# Altium footprint library smd-ipc.PCBLIB: 363 footprints (part 15 of 27)
Each footprint in its own frame and in the unit in brackets; x right, y up, seen from the top. Pads: shape width x height; smd on the part's side, far side on the other; paste and mask are expansions set on the pad; w line width, h text height; cw(c..) or ccw(c..) is an arc to the next point about the centre after c.
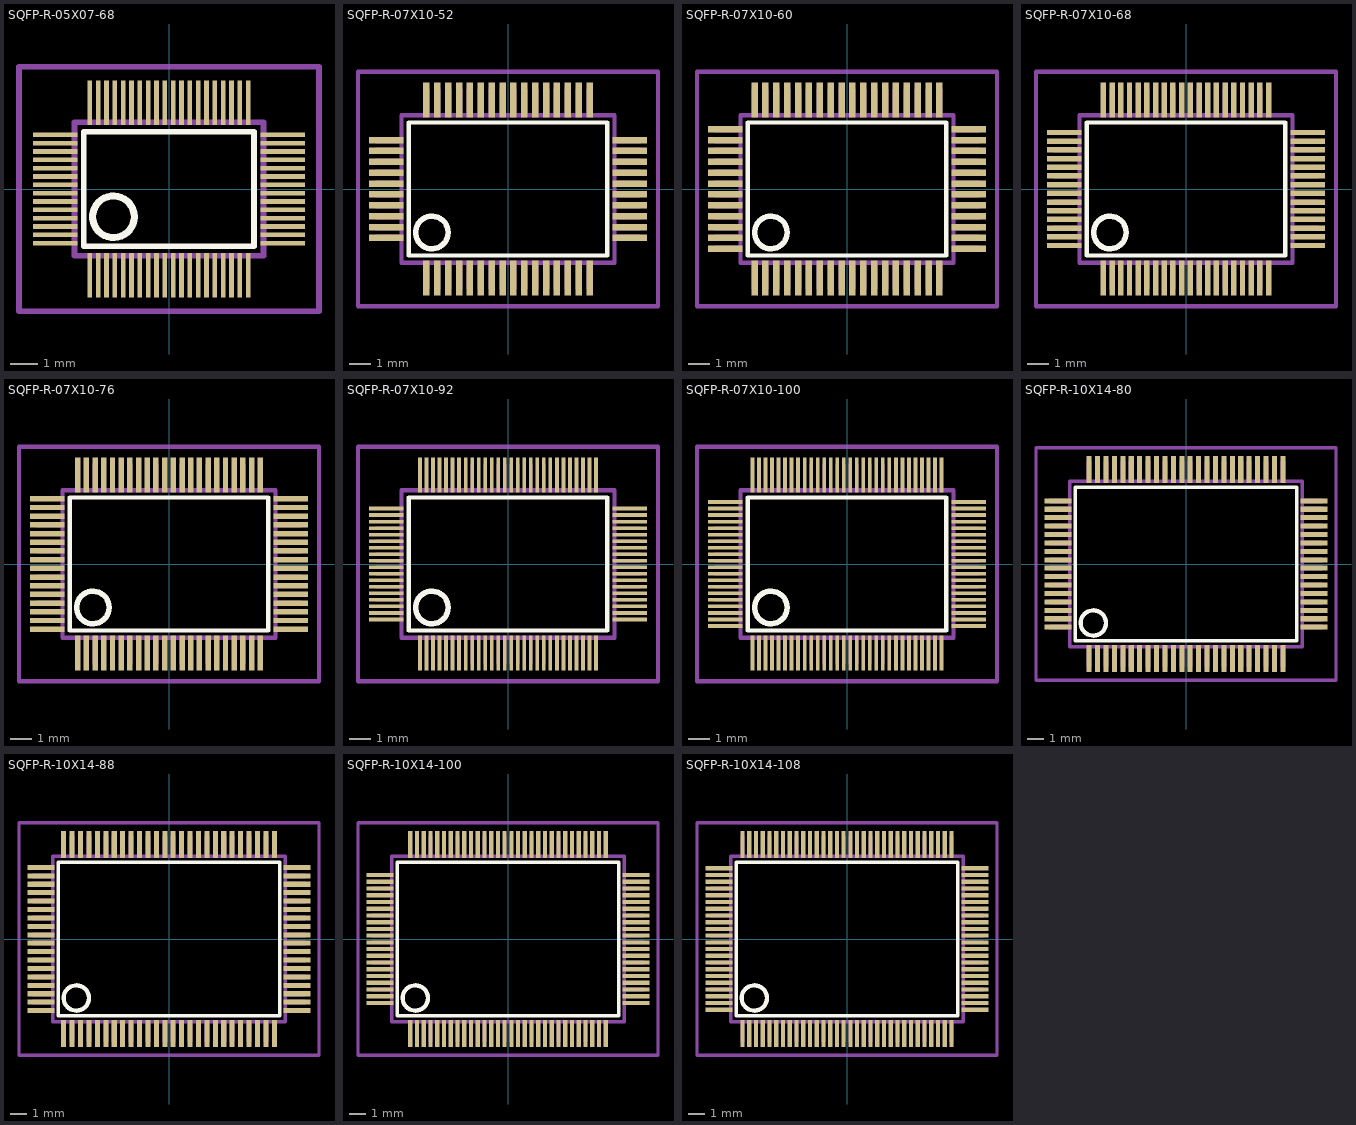
[diagram p14: the footprints below, top view; thin cyan lines are the x and y axes]

## SQFP-R-05X07-68 [mm]
pads (68):
  rect 0.17x1.6 smd: 1(-2.85,-3.1) 2(-2.55,-3.1) 3(-2.25,-3.1) 4(-1.95,-3.1) 5(-1.65,-3.1) 6(-1.35,-3.1) 7(-1.05,-3.1) 8(-0.75,-3.1) 9(-0.45,-3.1) 10(-0.15,-3.1) 11(0.15,-3.1) 12(0.45,-3.1) 13(0.75,-3.1) 14(1.05,-3.1) 15(1.35,-3.1) 16(1.65,-3.1) 17(1.95,-3.1) 18(2.25,-3.1) 19(2.55,-3.1) 20(2.85,-3.1) 35(2.85,3.1) 36(2.55,3.1) 37(2.25,3.1) 38(1.95,3.1) 39(1.65,3.1) 40(1.35,3.1) 41(1.05,3.1) 42(0.75,3.1) 43(0.45,3.1) 44(0.15,3.1) 45(-0.15,3.1) 46(-0.45,3.1) 47(-0.75,3.1) 48(-1.05,3.1) 49(-1.35,3.1) 50(-1.65,3.1) 51(-1.95,3.1) 52(-2.25,3.1) 53(-2.55,3.1) 54(-2.85,3.1)
  rect 1.6x0.17 smd: 21(4.1,-1.95) 22(4.1,-1.65) 23(4.1,-1.35) 24(4.1,-1.05) 25(4.1,-0.75) 26(4.1,-0.45) 27(4.1,-0.15) 28(4.1,0.15) 29(4.1,0.45) 30(4.1,0.75) 31(4.1,1.05) 32(4.1,1.35) 33(4.1,1.65) 34(4.1,1.95) 55(-4.1,1.95) 56(-4.1,1.65) 57(-4.1,1.35) 58(-4.1,1.05) 59(-4.1,0.75) 60(-4.1,0.45) 61(-4.1,0.15) 62(-4.1,-0.15) 63(-4.1,-0.45) 64(-4.1,-0.75) 65(-4.1,-1.05) 66(-4.1,-1.35) 67(-4.1,-1.65) 68(-4.1,-1.95)
Top Overlay:
  circle w0.254: c-2,-1 r0.75
  lines w0.203: -3.07,-2.06 3.06,-2.06 3.06,2.06 -3.07,2.06 -3.07,-2.06
Mechanical 16:
  rectangle: -2.92,-3.6 -2.78,-2.45
  rectangle: 3.45,-2.02 4.6,-1.88
  rectangle: -2.62,-3.6 -2.48,-2.45
  rectangle: -2.32,-3.6 -2.18,-2.45
  rectangle: -2.02,-3.6 -1.88,-2.45
  rectangle: -1.72,-3.6 -1.58,-2.45
  rectangle: -1.42,-3.6 -1.28,-2.45
  rectangle: -1.12,-3.6 -0.98,-2.45
  rectangle: -0.82,-3.6 -0.68,-2.45
  rectangle: -0.52,-3.6 -0.38,-2.45
  rectangle: -0.22,-3.6 -0.08,-2.45
  rectangle: 0.08,-3.6 0.22,-2.45
  rectangle: 0.38,-3.6 0.52,-2.45
  rectangle: 0.68,-3.6 0.82,-2.45
  rectangle: 0.98,-3.6 1.12,-2.45
  rectangle: 1.28,-3.6 1.42,-2.45
  rectangle: 1.58,-3.6 1.72,-2.45
  rectangle: 1.88,-3.6 2.02,-2.45
  rectangle: 2.18,-3.6 2.32,-2.45
  rectangle: 2.48,-3.6 2.62,-2.45
  rectangle: 2.78,-3.6 2.92,-2.45
  rectangle: 3.45,-1.72 4.6,-1.58
  rectangle: 3.45,-1.42 4.6,-1.28
  rectangle: 3.45,-1.12 4.6,-0.98
  rectangle: 3.45,-0.82 4.6,-0.68
  rectangle: 3.45,-0.52 4.6,-0.38
  rectangle: 3.45,-0.22 4.6,-0.08
  rectangle: 3.45,0.08 4.6,0.22
  rectangle: 3.45,0.38 4.6,0.52
  rectangle: 3.45,0.68 4.6,0.82
  rectangle: 3.45,0.98 4.6,1.12
  rectangle: 3.45,1.28 4.6,1.42
  rectangle: 3.45,1.58 4.6,1.72
  rectangle: 3.45,1.88 4.6,2.02
  rectangle: 2.78,2.45 2.92,3.6
  rectangle: 2.48,2.45 2.62,3.6
  rectangle: 2.18,2.45 2.32,3.6
  rectangle: 1.88,2.45 2.02,3.6
  rectangle: 1.58,2.45 1.72,3.6
  rectangle: 1.28,2.45 1.42,3.6
  rectangle: 0.98,2.45 1.12,3.6
  rectangle: 0.68,2.45 0.82,3.6
  rectangle: 0.38,2.45 0.52,3.6
  rectangle: 0.08,2.45 0.22,3.6
  rectangle: -0.22,2.45 -0.08,3.6
  rectangle: -0.52,2.45 -0.38,3.6
  rectangle: -0.82,2.45 -0.68,3.6
  rectangle: -1.12,2.45 -0.98,3.6
  rectangle: -1.42,2.45 -1.28,3.6
  rectangle: -1.72,2.45 -1.58,3.6
  rectangle: -2.02,2.45 -1.88,3.6
  rectangle: -2.32,2.45 -2.18,3.6
  rectangle: -2.62,2.45 -2.48,3.6
  rectangle: -2.92,2.45 -2.78,3.6
  rectangle: -4.6,1.88 -3.45,2.02
  rectangle: -4.6,1.58 -3.45,1.72
  rectangle: -4.6,1.28 -3.45,1.42
  rectangle: -4.6,0.98 -3.45,1.12
  rectangle: -4.6,0.68 -3.45,0.82
  rectangle: -4.6,0.38 -3.45,0.52
  rectangle: -4.6,0.08 -3.45,0.22
  rectangle: -4.6,-0.22 -3.45,-0.08
  rectangle: -4.6,-0.52 -3.45,-0.38
  rectangle: -4.6,-0.82 -3.45,-0.68
  rectangle: -4.6,-1.12 -3.45,-0.98
  rectangle: -4.6,-1.42 -3.45,-1.28
  rectangle: -4.6,-1.72 -3.45,-1.58
  rectangle: -4.6,-2.02 -3.45,-1.88
  lines w0.203: -3.4,-2.4 3.4,-2.4 3.4,2.4 -3.4,2.4 -3.4,-2.4
Mechanical 27:
  lines w0.2: -5.4,-4.4 -5.4,4.4 5.4,4.4 5.4,-4.4 -5.4,-4.4

## SQFP-R-07X10-52 [mm]
pads (52):
  rect 0.3x1.6 smd: 1(-3.75,-4.1) 2(-3.25,-4.1) 3(-2.75,-4.1) 4(-2.25,-4.1) 5(-1.75,-4.1) 6(-1.25,-4.1) 7(-0.75,-4.1) 8(-0.25,-4.1) 9(0.25,-4.1) 10(0.75,-4.1) 11(1.25,-4.1) 12(1.75,-4.1) 13(2.25,-4.1) 14(2.75,-4.1) 15(3.25,-4.1) 16(3.75,-4.1) 27(3.75,4.1) 28(3.25,4.1) 29(2.75,4.1) 30(2.25,4.1) 31(1.75,4.1) 32(1.25,4.1) 33(0.75,4.1) 34(0.25,4.1) 35(-0.25,4.1) 36(-0.75,4.1) 37(-1.25,4.1) 38(-1.75,4.1) 39(-2.25,4.1) 40(-2.75,4.1) 41(-3.25,4.1) 42(-3.75,4.1)
  rect 1.6x0.3 smd: 17(5.6,-2.25) 18(5.6,-1.75) 19(5.6,-1.25) 20(5.6,-0.75) 21(5.6,-0.25) 22(5.6,0.25) 23(5.6,0.75) 24(5.6,1.25) 25(5.6,1.75) 26(5.6,2.25) 43(-5.6,2.25) 44(-5.6,1.75) 45(-5.6,1.25) 46(-5.6,0.75) 47(-5.6,0.25) 48(-5.6,-0.25) 49(-5.6,-0.75) 50(-5.6,-1.25) 51(-5.6,-1.75) 52(-5.6,-2.25)
Top Overlay:
  circle w0.254: c-3.5,-2 r0.75
  lines w0.203: -4.57,-3.06 4.56,-3.06 4.56,3.06 -4.57,3.06 -4.57,-3.06
Mechanical 16:
  rectangle: -3.9,-4.6 -3.6,-3.45
  rectangle: 4.95,-2.4 6.1,-2.1
  rectangle: -3.4,-4.6 -3.1,-3.45
  rectangle: -2.9,-4.6 -2.6,-3.45
  rectangle: -2.4,-4.6 -2.1,-3.45
  rectangle: -1.9,-4.6 -1.6,-3.45
  rectangle: -1.4,-4.6 -1.1,-3.45
  rectangle: -0.9,-4.6 -0.6,-3.45
  rectangle: -0.4,-4.6 -0.1,-3.45
  rectangle: 0.1,-4.6 0.4,-3.45
  rectangle: 0.6,-4.6 0.9,-3.45
  rectangle: 1.1,-4.6 1.4,-3.45
  rectangle: 1.6,-4.6 1.9,-3.45
  rectangle: 2.1,-4.6 2.4,-3.45
  rectangle: 2.6,-4.6 2.9,-3.45
  rectangle: 3.1,-4.6 3.4,-3.45
  rectangle: 3.6,-4.6 3.9,-3.45
  rectangle: 4.95,-1.9 6.1,-1.6
  rectangle: 4.95,-1.4 6.1,-1.1
  rectangle: 4.95,-0.9 6.1,-0.6
  rectangle: 4.95,-0.4 6.1,-0.1
  rectangle: 4.95,0.1 6.1,0.4
  rectangle: 4.95,0.6 6.1,0.9
  rectangle: 4.95,1.1 6.1,1.4
  rectangle: 4.95,1.6 6.1,1.9
  rectangle: 4.95,2.1 6.1,2.4
  rectangle: 3.6,3.45 3.9,4.6
  rectangle: 3.1,3.45 3.4,4.6
  rectangle: 2.6,3.45 2.9,4.6
  rectangle: 2.1,3.45 2.4,4.6
  rectangle: 1.6,3.45 1.9,4.6
  rectangle: 1.1,3.45 1.4,4.6
  rectangle: 0.6,3.45 0.9,4.6
  rectangle: 0.1,3.45 0.4,4.6
  rectangle: -0.4,3.45 -0.1,4.6
  rectangle: -0.9,3.45 -0.6,4.6
  rectangle: -1.4,3.45 -1.1,4.6
  rectangle: -1.9,3.45 -1.6,4.6
  rectangle: -2.4,3.45 -2.1,4.6
  rectangle: -2.9,3.45 -2.6,4.6
  rectangle: -3.4,3.45 -3.1,4.6
  rectangle: -3.9,3.45 -3.6,4.6
  rectangle: -6.1,2.1 -4.95,2.4
  rectangle: -6.1,1.6 -4.95,1.9
  rectangle: -6.1,1.1 -4.95,1.4
  rectangle: -6.1,0.6 -4.95,0.9
  rectangle: -6.1,0.1 -4.95,0.4
  rectangle: -6.1,-0.4 -4.95,-0.1
  rectangle: -6.1,-0.9 -4.95,-0.6
  rectangle: -6.1,-1.4 -4.95,-1.1
  rectangle: -6.1,-1.9 -4.95,-1.6
  rectangle: -6.1,-2.4 -4.95,-2.1
  lines w0.203: -4.9,-3.4 4.9,-3.4 4.9,3.4 -4.9,3.4 -4.9,-3.4
Mechanical 27:
  lines w0.2: -6.9,-5.4 -6.9,5.4 6.9,5.4 6.9,-5.4 -6.9,-5.4

## SQFP-R-07X10-60 [mm]
pads (60):
  rect 0.3x1.6 smd: 1(-4.25,-4.1) 2(-3.75,-4.1) 3(-3.25,-4.1) 4(-2.75,-4.1) 5(-2.25,-4.1) 6(-1.75,-4.1) 7(-1.25,-4.1) 8(-0.75,-4.1) 9(-0.25,-4.1) 10(0.25,-4.1) 11(0.75,-4.1) 12(1.25,-4.1) 13(1.75,-4.1) 14(2.25,-4.1) 15(2.75,-4.1) 16(3.25,-4.1) 17(3.75,-4.1) 18(4.25,-4.1) 31(4.25,4.1) 32(3.75,4.1) 33(3.25,4.1) 34(2.75,4.1) 35(2.25,4.1) 36(1.75,4.1) 37(1.25,4.1) 38(0.75,4.1) 39(0.25,4.1) 40(-0.25,4.1) 41(-0.75,4.1) 42(-1.25,4.1) 43(-1.75,4.1) 44(-2.25,4.1) 45(-2.75,4.1) 46(-3.25,4.1) 47(-3.75,4.1) 48(-4.25,4.1)
  rect 1.6x0.3 smd: 19(5.6,-2.75) 20(5.6,-2.25) 21(5.6,-1.75) 22(5.6,-1.25) 23(5.6,-0.75) 24(5.6,-0.25) 25(5.6,0.25) 26(5.6,0.75) 27(5.6,1.25) 28(5.6,1.75) 29(5.6,2.25) 30(5.6,2.75) 49(-5.6,2.75) 50(-5.6,2.25) 51(-5.6,1.75) 52(-5.6,1.25) 53(-5.6,0.75) 54(-5.6,0.25) 55(-5.6,-0.25) 56(-5.6,-0.75) 57(-5.6,-1.25) 58(-5.6,-1.75) 59(-5.6,-2.25) 60(-5.6,-2.75)
Top Overlay:
  circle w0.254: c-3.5,-2 r0.75
  lines w0.203: -4.57,-3.06 4.56,-3.06 4.56,3.06 -4.57,3.06 -4.57,-3.06
Mechanical 16:
  rectangle: -4.4,-4.6 -4.1,-3.45
  rectangle: 4.95,-2.9 6.1,-2.6
  rectangle: -3.9,-4.6 -3.6,-3.45
  rectangle: -3.4,-4.6 -3.1,-3.45
  rectangle: -2.9,-4.6 -2.6,-3.45
  rectangle: -2.4,-4.6 -2.1,-3.45
  rectangle: -1.9,-4.6 -1.6,-3.45
  rectangle: -1.4,-4.6 -1.1,-3.45
  rectangle: -0.9,-4.6 -0.6,-3.45
  rectangle: -0.4,-4.6 -0.1,-3.45
  rectangle: 0.1,-4.6 0.4,-3.45
  rectangle: 0.6,-4.6 0.9,-3.45
  rectangle: 1.1,-4.6 1.4,-3.45
  rectangle: 1.6,-4.6 1.9,-3.45
  rectangle: 2.1,-4.6 2.4,-3.45
  rectangle: 2.6,-4.6 2.9,-3.45
  rectangle: 3.1,-4.6 3.4,-3.45
  rectangle: 3.6,-4.6 3.9,-3.45
  rectangle: 4.1,-4.6 4.4,-3.45
  rectangle: 4.95,-2.4 6.1,-2.1
  rectangle: 4.95,-1.9 6.1,-1.6
  rectangle: 4.95,-1.4 6.1,-1.1
  rectangle: 4.95,-0.9 6.1,-0.6
  rectangle: 4.95,-0.4 6.1,-0.1
  rectangle: 4.95,0.1 6.1,0.4
  rectangle: 4.95,0.6 6.1,0.9
  rectangle: 4.95,1.1 6.1,1.4
  rectangle: 4.95,1.6 6.1,1.9
  rectangle: 4.95,2.1 6.1,2.4
  rectangle: 4.95,2.6 6.1,2.9
  rectangle: 4.1,3.45 4.4,4.6
  rectangle: 3.6,3.45 3.9,4.6
  rectangle: 3.1,3.45 3.4,4.6
  rectangle: 2.6,3.45 2.9,4.6
  rectangle: 2.1,3.45 2.4,4.6
  rectangle: 1.6,3.45 1.9,4.6
  rectangle: 1.1,3.45 1.4,4.6
  rectangle: 0.6,3.45 0.9,4.6
  rectangle: 0.1,3.45 0.4,4.6
  rectangle: -0.4,3.45 -0.1,4.6
  rectangle: -0.9,3.45 -0.6,4.6
  rectangle: -1.4,3.45 -1.1,4.6
  rectangle: -1.9,3.45 -1.6,4.6
  rectangle: -2.4,3.45 -2.1,4.6
  rectangle: -2.9,3.45 -2.6,4.6
  rectangle: -3.4,3.45 -3.1,4.6
  rectangle: -3.9,3.45 -3.6,4.6
  rectangle: -4.4,3.45 -4.1,4.6
  rectangle: -6.1,2.6 -4.95,2.9
  rectangle: -6.1,2.1 -4.95,2.4
  rectangle: -6.1,1.6 -4.95,1.9
  rectangle: -6.1,1.1 -4.95,1.4
  rectangle: -6.1,0.6 -4.95,0.9
  rectangle: -6.1,0.1 -4.95,0.4
  rectangle: -6.1,-0.4 -4.95,-0.1
  rectangle: -6.1,-0.9 -4.95,-0.6
  rectangle: -6.1,-1.4 -4.95,-1.1
  rectangle: -6.1,-1.9 -4.95,-1.6
  rectangle: -6.1,-2.4 -4.95,-2.1
  rectangle: -6.1,-2.9 -4.95,-2.6
  lines w0.203: -4.9,-3.4 4.9,-3.4 4.9,3.4 -4.9,3.4 -4.9,-3.4
Mechanical 27:
  lines w0.2: -6.9,-5.4 -6.9,5.4 6.9,5.4 6.9,-5.4 -6.9,-5.4

## SQFP-R-07X10-68 [mm]
pads (68):
  rect 0.25x1.6 smd: 1(-3.8,-4.1) 2(-3.4,-4.1) 3(-3,-4.1) 4(-2.6,-4.1) 5(-2.2,-4.1) 6(-1.8,-4.1) 7(-1.4,-4.1) 8(-1,-4.1) 9(-0.6,-4.1) 10(-0.2,-4.1) 11(0.2,-4.1) 12(0.6,-4.1) 13(1,-4.1) 14(1.4,-4.1) 15(1.8,-4.1) 16(2.2,-4.1) 17(2.6,-4.1) 18(3,-4.1) 19(3.4,-4.1) 20(3.8,-4.1) 35(3.8,4.1) 36(3.4,4.1) 37(3,4.1) 38(2.6,4.1) 39(2.2,4.1) 40(1.8,4.1) 41(1.4,4.1) 42(1,4.1) 43(0.6,4.1) 44(0.2,4.1) 45(-0.2,4.1) 46(-0.6,4.1) 47(-1,4.1) 48(-1.4,4.1) 49(-1.8,4.1) 50(-2.2,4.1) 51(-2.6,4.1) 52(-3,4.1) 53(-3.4,4.1) 54(-3.8,4.1)
  rect 1.6x0.25 smd: 21(5.6,-2.6) 22(5.6,-2.2) 23(5.6,-1.8) 24(5.6,-1.4) 25(5.6,-1) 26(5.6,-0.6) 27(5.6,-0.2) 28(5.6,0.2) 29(5.6,0.6) 30(5.6,1) 31(5.6,1.4) 32(5.6,1.8) 33(5.6,2.2) 34(5.6,2.6) 55(-5.6,2.6) 56(-5.6,2.2) 57(-5.6,1.8) 58(-5.6,1.4) 59(-5.6,1) 60(-5.6,0.6) 61(-5.6,0.2) 62(-5.6,-0.2) 63(-5.6,-0.6) 64(-5.6,-1) 65(-5.6,-1.4) 66(-5.6,-1.8) 67(-5.6,-2.2) 68(-5.6,-2.6)
Top Overlay:
  circle w0.254: c-3.5,-2 r0.75
  lines w0.203: -4.57,-3.06 4.56,-3.06 4.56,3.06 -4.57,3.06 -4.57,-3.06
Mechanical 16:
  rectangle: -3.91,-4.6 -3.69,-3.45
  rectangle: 4.95,-2.71 6.1,-2.49
  rectangle: -3.51,-4.6 -3.29,-3.45
  rectangle: -3.11,-4.6 -2.89,-3.45
  rectangle: -2.71,-4.6 -2.49,-3.45
  rectangle: -2.31,-4.6 -2.09,-3.45
  rectangle: -1.91,-4.6 -1.69,-3.45
  rectangle: -1.51,-4.6 -1.29,-3.45
  rectangle: -1.11,-4.6 -0.89,-3.45
  rectangle: -0.71,-4.6 -0.49,-3.45
  rectangle: -0.31,-4.6 -0.09,-3.45
  rectangle: 0.09,-4.6 0.31,-3.45
  rectangle: 0.49,-4.6 0.71,-3.45
  rectangle: 0.89,-4.6 1.11,-3.45
  rectangle: 1.29,-4.6 1.51,-3.45
  rectangle: 1.69,-4.6 1.91,-3.45
  rectangle: 2.09,-4.6 2.31,-3.45
  rectangle: 2.49,-4.6 2.71,-3.45
  rectangle: 2.89,-4.6 3.11,-3.45
  rectangle: 3.29,-4.6 3.51,-3.45
  rectangle: 3.69,-4.6 3.91,-3.45
  rectangle: 4.95,-2.31 6.1,-2.09
  rectangle: 4.95,-1.91 6.1,-1.69
  rectangle: 4.95,-1.51 6.1,-1.29
  rectangle: 4.95,-1.11 6.1,-0.89
  rectangle: 4.95,-0.71 6.1,-0.49
  rectangle: 4.95,-0.31 6.1,-0.09
  rectangle: 4.95,0.09 6.1,0.31
  rectangle: 4.95,0.49 6.1,0.71
  rectangle: 4.95,0.89 6.1,1.11
  rectangle: 4.95,1.29 6.1,1.51
  rectangle: 4.95,1.69 6.1,1.91
  rectangle: 4.95,2.09 6.1,2.31
  rectangle: 4.95,2.49 6.1,2.71
  rectangle: 3.69,3.45 3.91,4.6
  rectangle: 3.29,3.45 3.51,4.6
  rectangle: 2.89,3.45 3.11,4.6
  rectangle: 2.49,3.45 2.71,4.6
  rectangle: 2.09,3.45 2.31,4.6
  rectangle: 1.69,3.45 1.91,4.6
  rectangle: 1.29,3.45 1.51,4.6
  rectangle: 0.89,3.45 1.11,4.6
  rectangle: 0.49,3.45 0.71,4.6
  rectangle: 0.09,3.45 0.31,4.6
  rectangle: -0.31,3.45 -0.09,4.6
  rectangle: -0.71,3.45 -0.49,4.6
  rectangle: -1.11,3.45 -0.89,4.6
  rectangle: -1.51,3.45 -1.29,4.6
  rectangle: -1.91,3.45 -1.69,4.6
  rectangle: -2.31,3.45 -2.09,4.6
  rectangle: -2.71,3.45 -2.49,4.6
  rectangle: -3.11,3.45 -2.89,4.6
  rectangle: -3.51,3.45 -3.29,4.6
  rectangle: -3.91,3.45 -3.69,4.6
  rectangle: -6.1,2.49 -4.95,2.71
  rectangle: -6.1,2.09 -4.95,2.31
  rectangle: -6.1,1.69 -4.95,1.91
  rectangle: -6.1,1.29 -4.95,1.51
  rectangle: -6.1,0.89 -4.95,1.11
  rectangle: -6.1,0.49 -4.95,0.71
  rectangle: -6.1,0.09 -4.95,0.31
  rectangle: -6.1,-0.31 -4.95,-0.09
  rectangle: -6.1,-0.71 -4.95,-0.49
  rectangle: -6.1,-1.11 -4.95,-0.89
  rectangle: -6.1,-1.51 -4.95,-1.29
  rectangle: -6.1,-1.91 -4.95,-1.69
  rectangle: -6.1,-2.31 -4.95,-2.09
  rectangle: -6.1,-2.71 -4.95,-2.49
  lines w0.203: -4.9,-3.4 4.9,-3.4 4.9,3.4 -4.9,3.4 -4.9,-3.4
Mechanical 27:
  lines w0.2: -6.9,-5.4 -6.9,5.4 6.9,5.4 6.9,-5.4 -6.9,-5.4

## SQFP-R-07X10-76 [mm]
pads (76):
  rect 0.25x1.6 smd: 1(-4.2,-4.1) 2(-3.8,-4.1) 3(-3.4,-4.1) 4(-3,-4.1) 5(-2.6,-4.1) 6(-2.2,-4.1) 7(-1.8,-4.1) 8(-1.4,-4.1) 9(-1,-4.1) 10(-0.6,-4.1) 11(-0.2,-4.1) 12(0.2,-4.1) 13(0.6,-4.1) 14(1,-4.1) 15(1.4,-4.1) 16(1.8,-4.1) 17(2.2,-4.1) 18(2.6,-4.1) 19(3,-4.1) 20(3.4,-4.1) 21(3.8,-4.1) 22(4.2,-4.1) 39(4.2,4.1) 40(3.8,4.1) 41(3.4,4.1) 42(3,4.1) 43(2.6,4.1) 44(2.2,4.1) 45(1.8,4.1) 46(1.4,4.1) 47(1,4.1) 48(0.6,4.1) 49(0.2,4.1) 50(-0.2,4.1) 51(-0.6,4.1) 52(-1,4.1) 53(-1.4,4.1) 54(-1.8,4.1) 55(-2.2,4.1) 56(-2.6,4.1) 57(-3,4.1) 58(-3.4,4.1) 59(-3.8,4.1) 60(-4.2,4.1)
  rect 1.6x0.25 smd: 23(5.6,-3) 24(5.6,-2.6) 25(5.6,-2.2) 26(5.6,-1.8) 27(5.6,-1.4) 28(5.6,-1) 29(5.6,-0.6) 30(5.6,-0.2) 31(5.6,0.2) 32(5.6,0.6) 33(5.6,1) 34(5.6,1.4) 35(5.6,1.8) 36(5.6,2.2) 37(5.6,2.6) 38(5.6,3) 61(-5.6,3) 62(-5.6,2.6) 63(-5.6,2.2) 64(-5.6,1.8) 65(-5.6,1.4) 66(-5.6,1) 67(-5.6,0.6) 68(-5.6,0.2) 69(-5.6,-0.2) 70(-5.6,-0.6) 71(-5.6,-1) 72(-5.6,-1.4) 73(-5.6,-1.8) 74(-5.6,-2.2) 75(-5.6,-2.6) 76(-5.6,-3)
Top Overlay:
  circle w0.254: c-3.5,-2 r0.75
  lines w0.203: -4.57,-3.06 4.56,-3.06 4.56,3.06 -4.57,3.06 -4.57,-3.06
Mechanical 16:
  rectangle: -4.31,-4.6 -4.09,-3.45
  rectangle: 4.95,-3.11 6.1,-2.89
  rectangle: -3.91,-4.6 -3.69,-3.45
  rectangle: -3.51,-4.6 -3.29,-3.45
  rectangle: -3.11,-4.6 -2.89,-3.45
  rectangle: -2.71,-4.6 -2.49,-3.45
  rectangle: -2.31,-4.6 -2.09,-3.45
  rectangle: -1.91,-4.6 -1.69,-3.45
  rectangle: -1.51,-4.6 -1.29,-3.45
  rectangle: -1.11,-4.6 -0.89,-3.45
  rectangle: -0.71,-4.6 -0.49,-3.45
  rectangle: -0.31,-4.6 -0.09,-3.45
  rectangle: 0.09,-4.6 0.31,-3.45
  rectangle: 0.49,-4.6 0.71,-3.45
  rectangle: 0.89,-4.6 1.11,-3.45
  rectangle: 1.29,-4.6 1.51,-3.45
  rectangle: 1.69,-4.6 1.91,-3.45
  rectangle: 2.09,-4.6 2.31,-3.45
  rectangle: 2.49,-4.6 2.71,-3.45
  rectangle: 2.89,-4.6 3.11,-3.45
  rectangle: 3.29,-4.6 3.51,-3.45
  rectangle: 3.69,-4.6 3.91,-3.45
  rectangle: 4.09,-4.6 4.31,-3.45
  rectangle: 4.95,-2.71 6.1,-2.49
  rectangle: 4.95,-2.31 6.1,-2.09
  rectangle: 4.95,-1.91 6.1,-1.69
  rectangle: 4.95,-1.51 6.1,-1.29
  rectangle: 4.95,-1.11 6.1,-0.89
  rectangle: 4.95,-0.71 6.1,-0.49
  rectangle: 4.95,-0.31 6.1,-0.09
  rectangle: 4.95,0.09 6.1,0.31
  rectangle: 4.95,0.49 6.1,0.71
  rectangle: 4.95,0.89 6.1,1.11
  rectangle: 4.95,1.29 6.1,1.51
  rectangle: 4.95,1.69 6.1,1.91
  rectangle: 4.95,2.09 6.1,2.31
  rectangle: 4.95,2.49 6.1,2.71
  rectangle: 4.95,2.89 6.1,3.11
  rectangle: 4.09,3.45 4.31,4.6
  rectangle: 3.69,3.45 3.91,4.6
  rectangle: 3.29,3.45 3.51,4.6
  rectangle: 2.89,3.45 3.11,4.6
  rectangle: 2.49,3.45 2.71,4.6
  rectangle: 2.09,3.45 2.31,4.6
  rectangle: 1.69,3.45 1.91,4.6
  rectangle: 1.29,3.45 1.51,4.6
  rectangle: 0.89,3.45 1.11,4.6
  rectangle: 0.49,3.45 0.71,4.6
  rectangle: 0.09,3.45 0.31,4.6
  rectangle: -0.31,3.45 -0.09,4.6
  rectangle: -0.71,3.45 -0.49,4.6
  rectangle: -1.11,3.45 -0.89,4.6
  rectangle: -1.51,3.45 -1.29,4.6
  rectangle: -1.91,3.45 -1.69,4.6
  rectangle: -2.31,3.45 -2.09,4.6
  rectangle: -2.71,3.45 -2.49,4.6
  rectangle: -3.11,3.45 -2.89,4.6
  rectangle: -3.51,3.45 -3.29,4.6
  rectangle: -3.91,3.45 -3.69,4.6
  rectangle: -4.31,3.45 -4.09,4.6
  rectangle: -6.1,2.89 -4.95,3.11
  rectangle: -6.1,2.49 -4.95,2.71
  rectangle: -6.1,2.09 -4.95,2.31
  rectangle: -6.1,1.69 -4.95,1.91
  rectangle: -6.1,1.29 -4.95,1.51
  rectangle: -6.1,0.89 -4.95,1.11
  rectangle: -6.1,0.49 -4.95,0.71
  rectangle: -6.1,0.09 -4.95,0.31
  rectangle: -6.1,-0.31 -4.95,-0.09
  rectangle: -6.1,-0.71 -4.95,-0.49
  rectangle: -6.1,-1.11 -4.95,-0.89
  rectangle: -6.1,-1.51 -4.95,-1.29
  rectangle: -6.1,-1.91 -4.95,-1.69
  rectangle: -6.1,-2.31 -4.95,-2.09
  rectangle: -6.1,-2.71 -4.95,-2.49
  rectangle: -6.1,-3.11 -4.95,-2.89
  lines w0.203: -4.9,-3.4 4.9,-3.4 4.9,3.4 -4.9,3.4 -4.9,-3.4
Mechanical 27:
  lines w0.2: -6.9,-5.4 -6.9,5.4 6.9,5.4 6.9,-5.4 -6.9,-5.4

## SQFP-R-07X10-92 [mm]
pads (92):
  rect 0.17x1.6 smd: 1(-4.05,-4.1) 2(-3.75,-4.1) 3(-3.45,-4.1) 4(-3.15,-4.1) 5(-2.85,-4.1) 6(-2.55,-4.1) 7(-2.25,-4.1) 8(-1.95,-4.1) 9(-1.65,-4.1) 10(-1.35,-4.1) 11(-1.05,-4.1) 12(-0.75,-4.1) 13(-0.45,-4.1) 14(-0.15,-4.1) 15(0.15,-4.1) 16(0.45,-4.1) 17(0.75,-4.1) 18(1.05,-4.1) 19(1.35,-4.1) 20(1.65,-4.1) 21(1.95,-4.1) 22(2.25,-4.1) 23(2.55,-4.1) 24(2.85,-4.1) 25(3.15,-4.1) 26(3.45,-4.1) 27(3.75,-4.1) 28(4.05,-4.1) 47(4.05,4.1) 48(3.75,4.1) 49(3.45,4.1) 50(3.15,4.1) 51(2.85,4.1) 52(2.55,4.1) 53(2.25,4.1) 54(1.95,4.1) 55(1.65,4.1) 56(1.35,4.1) 57(1.05,4.1) 58(0.75,4.1) 59(0.45,4.1) 60(0.15,4.1) 61(-0.15,4.1) 62(-0.45,4.1) 63(-0.75,4.1) 64(-1.05,4.1) 65(-1.35,4.1) 66(-1.65,4.1) 67(-1.95,4.1) 68(-2.25,4.1) 69(-2.55,4.1) 70(-2.85,4.1) 71(-3.15,4.1) 72(-3.45,4.1) 73(-3.75,4.1) 74(-4.05,4.1)
  rect 1.6x0.17 smd: 29(5.6,-2.55) 30(5.6,-2.25) 31(5.6,-1.95) 32(5.6,-1.65) 33(5.6,-1.35) 34(5.6,-1.05) 35(5.6,-0.75) 36(5.6,-0.45) 37(5.6,-0.15) 38(5.6,0.15) 39(5.6,0.45) 40(5.6,0.75) 41(5.6,1.05) 42(5.6,1.35) 43(5.6,1.65) 44(5.6,1.95) 45(5.6,2.25) 46(5.6,2.55) 75(-5.6,2.55) 76(-5.6,2.25) 77(-5.6,1.95) 78(-5.6,1.65) 79(-5.6,1.35) 80(-5.6,1.05) 81(-5.6,0.75) 82(-5.6,0.45) 83(-5.6,0.15) 84(-5.6,-0.15) 85(-5.6,-0.45) 86(-5.6,-0.75) 87(-5.6,-1.05) 88(-5.6,-1.35) 89(-5.6,-1.65) 90(-5.6,-1.95) 91(-5.6,-2.25) 92(-5.6,-2.55)
Top Overlay:
  circle w0.254: c-3.5,-2 r0.75
  lines w0.203: -4.57,-3.06 4.56,-3.06 4.56,3.06 -4.57,3.06 -4.57,-3.06
Mechanical 16:
  rectangle: -4.12,-4.6 -3.98,-3.45
  rectangle: 4.95,-2.62 6.1,-2.48
  rectangle: -3.82,-4.6 -3.68,-3.45
  rectangle: -3.52,-4.6 -3.38,-3.45
  rectangle: -3.22,-4.6 -3.08,-3.45
  rectangle: -2.92,-4.6 -2.78,-3.45
  rectangle: -2.62,-4.6 -2.48,-3.45
  rectangle: -2.32,-4.6 -2.18,-3.45
  rectangle: -2.02,-4.6 -1.88,-3.45
  rectangle: -1.72,-4.6 -1.58,-3.45
  rectangle: -1.42,-4.6 -1.28,-3.45
  rectangle: -1.12,-4.6 -0.98,-3.45
  rectangle: -0.82,-4.6 -0.68,-3.45
  rectangle: -0.52,-4.6 -0.38,-3.45
  rectangle: -0.22,-4.6 -0.08,-3.45
  rectangle: 0.08,-4.6 0.22,-3.45
  rectangle: 0.38,-4.6 0.52,-3.45
  rectangle: 0.68,-4.6 0.82,-3.45
  rectangle: 0.98,-4.6 1.12,-3.45
  rectangle: 1.28,-4.6 1.42,-3.45
  rectangle: 1.58,-4.6 1.72,-3.45
  rectangle: 1.88,-4.6 2.02,-3.45
  rectangle: 2.18,-4.6 2.32,-3.45
  rectangle: 2.48,-4.6 2.62,-3.45
  rectangle: 2.78,-4.6 2.92,-3.45
  rectangle: 3.08,-4.6 3.22,-3.45
  rectangle: 3.38,-4.6 3.52,-3.45
  rectangle: 3.68,-4.6 3.82,-3.45
  rectangle: 3.98,-4.6 4.12,-3.45
  rectangle: 4.95,-2.32 6.1,-2.18
  rectangle: 4.95,-2.02 6.1,-1.88
  rectangle: 4.95,-1.72 6.1,-1.58
  rectangle: 4.95,-1.42 6.1,-1.28
  rectangle: 4.95,-1.12 6.1,-0.98
  rectangle: 4.95,-0.82 6.1,-0.68
  rectangle: 4.95,-0.52 6.1,-0.38
  rectangle: 4.95,-0.22 6.1,-0.08
  rectangle: 4.95,0.08 6.1,0.22
  rectangle: 4.95,0.38 6.1,0.52
  rectangle: 4.95,0.68 6.1,0.82
  rectangle: 4.95,0.98 6.1,1.12
  rectangle: 4.95,1.28 6.1,1.42
  rectangle: 4.95,1.58 6.1,1.72
  rectangle: 4.95,1.88 6.1,2.02
  rectangle: 4.95,2.18 6.1,2.32
  rectangle: 4.95,2.48 6.1,2.62
  rectangle: 3.98,3.45 4.12,4.6
  rectangle: 3.68,3.45 3.82,4.6
  rectangle: 3.38,3.45 3.52,4.6
  rectangle: 3.08,3.45 3.22,4.6
  rectangle: 2.78,3.45 2.92,4.6
  rectangle: 2.48,3.45 2.62,4.6
  rectangle: 2.18,3.45 2.32,4.6
  rectangle: 1.88,3.45 2.02,4.6
  rectangle: 1.58,3.45 1.72,4.6
  rectangle: 1.28,3.45 1.42,4.6
  rectangle: 0.98,3.45 1.12,4.6
  rectangle: 0.68,3.45 0.82,4.6
  rectangle: 0.38,3.45 0.52,4.6
  rectangle: 0.08,3.45 0.22,4.6
  rectangle: -0.22,3.45 -0.08,4.6
  rectangle: -0.52,3.45 -0.38,4.6
  rectangle: -0.82,3.45 -0.68,4.6
  rectangle: -1.12,3.45 -0.98,4.6
  rectangle: -1.42,3.45 -1.28,4.6
  rectangle: -1.72,3.45 -1.58,4.6
  rectangle: -2.02,3.45 -1.88,4.6
  rectangle: -2.32,3.45 -2.18,4.6
  rectangle: -2.62,3.45 -2.48,4.6
  rectangle: -2.92,3.45 -2.78,4.6
  rectangle: -3.22,3.45 -3.08,4.6
  rectangle: -3.52,3.45 -3.38,4.6
  rectangle: -3.82,3.45 -3.68,4.6
  rectangle: -4.12,3.45 -3.98,4.6
  rectangle: -6.1,2.48 -4.95,2.62
  rectangle: -6.1,2.18 -4.95,2.32
  rectangle: -6.1,1.88 -4.95,2.02
  rectangle: -6.1,1.58 -4.95,1.72
  rectangle: -6.1,1.28 -4.95,1.42
  rectangle: -6.1,0.98 -4.95,1.12
  rectangle: -6.1,0.68 -4.95,0.82
  rectangle: -6.1,0.38 -4.95,0.52
  rectangle: -6.1,0.08 -4.95,0.22
  rectangle: -6.1,-0.22 -4.95,-0.08
  rectangle: -6.1,-0.52 -4.95,-0.38
  rectangle: -6.1,-0.82 -4.95,-0.68